# Altium footprint library Connectors Pad Lib.PcbLib: 211 footprints (part 7 of 14)
Each footprint in its own frame and in the unit in brackets; x right, y up, seen from the top. Pads: shape width x height; smd on the part's side, far side on the other; paste and mask are expansions set on the pad; w line width, h text height; cw(c..) or ccw(c..) is an arc to the next point about the centre after c.
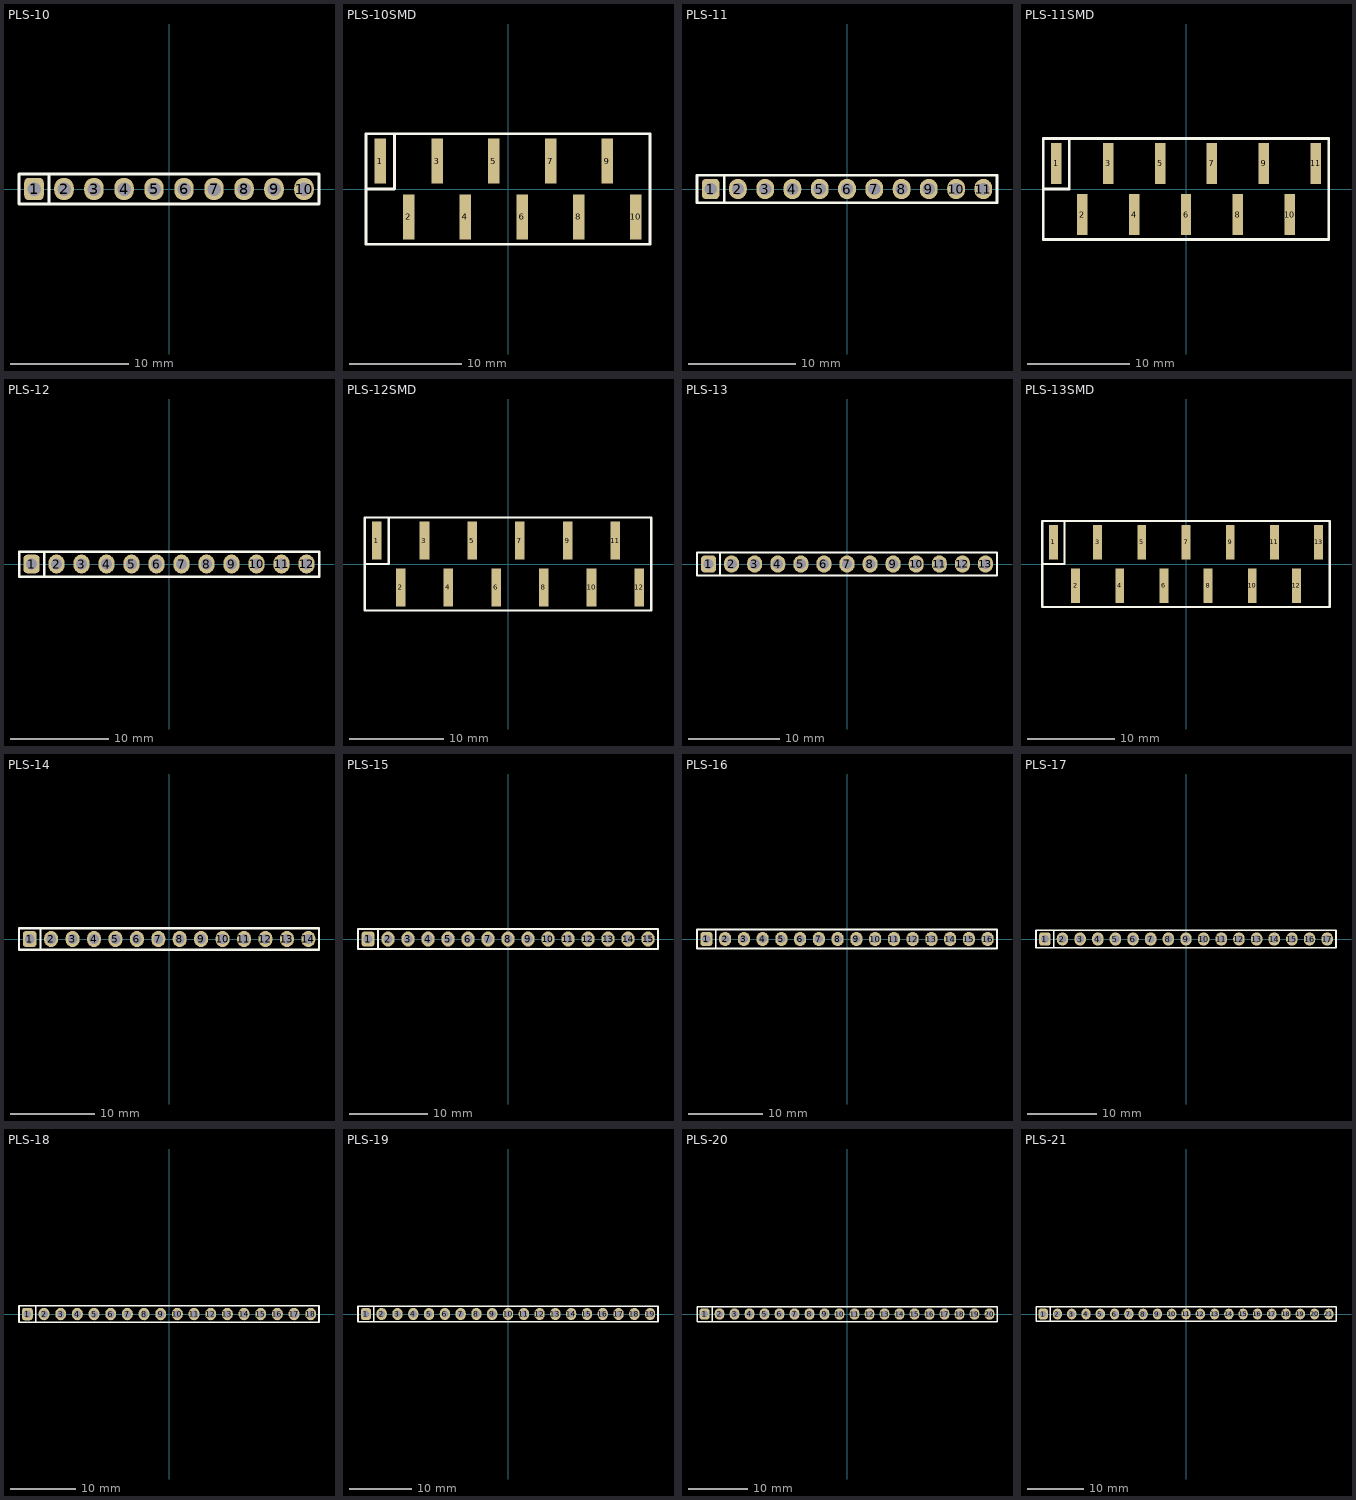
[diagram p6: the footprints below, top view; thin cyan lines are the x and y axes]

## PLS-10 [mil] "PCB Vertical Single Connector 10-Pin"
height 336.22
pads (10):
  rrect50% 65x75 hole 45: 1(-450,0)
  oval 65x75 hole 45: 2(-350,0) 3(-250,0) 4(-150,0) 5(-50,0) 6(50,0) 7(150,0) 8(250,0) 9(350,0) 10(450,0)
Top Overlay:
  lines w10: -400,-50 -400,50 ; -500,-50 -500,50 500,50 500,-50 -500,-50
3D body "PLS-10.STEP": height 337.22, standoff -117.11, extent -500,-50 500,50

## PLS-10SMD [mm] "PCB Vertical Single Connector SMD 10-Pin"
height 10.338
pads (10):
  rect 1.02x4 smd: 1(-11.43,2.5) 2(-8.89,-2.5) 3(-6.35,2.5) 4(-3.81,-2.5) 5(-1.27,2.5) 6(1.27,-2.5) 7(3.81,2.5) 8(6.35,-2.5) 9(8.89,2.5) 10(11.43,-2.5)
Top Overlay:
  lines w0.254: -12.7,0 -10.16,0 -10.16,4.953 -0.127,4.953 ; -12.7,-4.953 12.7,-4.953 12.7,4.953 -12.7,4.953 -12.7,-4.953
3D body "PLS-10SMD.STEP": height 10.34, standoff -0.02, extent -12.7,-4.27 12.7,4.27

## PLS-11 [mil] "PCB Vertical Single Connector 11-Pin"
height 336.22
pads (11):
  rrect50% 65x75 hole 45: 1(-500,0)
  oval 65x75 hole 45: 2(-400,0) 3(-300,0) 4(-200,0) 5(-100,0) 6(0,0) 7(100,0) 8(200,0) 9(300,0) 10(400,0) 11(500,0)
Top Overlay:
  lines w10: -450,-50 -450,50 ; -550,-50 550,-50 550,50 -550,50 -550,-50
3D body "PLS-11.STEP": height 341.16, standoff -117.11, extent -550,-50 550,50

## PLS-11SMD [mm] "PCB Vertical Single Connector SMD 11-Pin"
height 10.338
pads (11):
  rect 1.02x4 smd: 1(-12.7,2.5) 2(-10.16,-2.5) 3(-7.62,2.5) 4(-5.08,-2.5) 5(-2.54,2.5) 6(0,-2.5) 7(2.54,2.5) 8(5.08,-2.5) 9(7.62,2.5) 10(10.16,-2.5) 11(12.7,2.5)
Top Overlay:
  lines w0.254: -13.97,0 -11.43,0 -11.43,4.953 -0.127,4.953 ; -13.97,-4.953 -13.97,4.953 13.97,4.953 13.97,-4.953 -13.97,-4.953
3D body "PLS-11SMD.STEP": height 10.34, standoff -0.02, extent -13.97,-4.27 13.97,4.27

## PLS-12 [mil] "PCB Vertical Single Connector 12-Pin"
height 336.22
pads (12):
  rrect50% 65x75 hole 45: 1(-550,0)
  oval 65x75 hole 45: 2(-450,0) 3(-350,0) 4(-250,0) 5(-150,0) 6(-50,0) 7(50,0) 8(150,0) 9(250,0) 10(350,0) 11(450,0) 12(550,0)
Top Overlay:
  lines w10: -500,-50 -500,50 ; -600,-50 600,-50 600,50 -600,50 -600,-50
3D body "PLS-12.STEP": height 337.22, standoff -117.11, extent -600,-50 600,50

## PLS-12SMD [mm] "PCB Vertical Single Connector SMD 12-Pin"
height 10.338
pads (12):
  rect 1.02x4 smd: 1(-13.97,2.5) 2(-11.43,-2.5) 3(-8.89,2.5) 4(-6.35,-2.5) 5(-3.81,2.5) 6(-1.27,-2.5) 7(1.27,2.5) 8(3.81,-2.5) 9(6.35,2.5) 10(8.89,-2.5) 11(11.43,2.5) 12(13.97,-2.5)
Top Overlay:
  lines w0.254: -15.24,0 -12.7,0 -12.7,4.953 -0.127,4.953 ; -15.24,-4.953 15.24,-4.953 15.24,4.953 -15.24,4.953 -15.24,-4.953
3D body "PLS-12SMD.STEP": height 10.34, standoff -0.02, extent -15.24,-4.27 15.24,4.27

## PLS-13 [mil] "PCB Vertical Single Connector 13-Pin"
height 336.22
pads (13):
  rrect50% 65x75 hole 45: 1(-600,0)
  oval 65x75 hole 45: 2(-500,0) 3(-400,0) 4(-300,0) 5(-200,0) 6(-100,0) 7(0,0) 8(100,0) 9(200,0) 10(300,0) 11(400,0) 12(500,0) 13(600,0)
Top Overlay:
  lines w10: -550,-50 -550,50 ; -650,-50 650,-50 650,50 -650,50 -650,-50
3D body "PLS-13.STEP": height 341.16, standoff -117.11, extent -650,-50 650,50

## PLS-13SMD [mm] "PCB Vertical Single Connector SMD 13-Pin"
height 10.338
pads (13):
  rect 1.02x4 smd: 1(-15.24,2.5) 2(-12.7,-2.5) 3(-10.16,2.5) 4(-7.62,-2.5) 5(-5.08,2.5) 6(-2.54,-2.5) 7(0,2.5) 8(2.54,-2.5) 9(5.08,2.5) 10(7.62,-2.5) 11(10.16,2.5) 12(12.7,-2.5) 13(15.24,2.5)
Top Overlay:
  lines w0.254: -16.51,0 -13.97,0 -13.97,4.953 -0.127,4.953 ; -16.51,-4.953 16.51,-4.953 16.51,4.953 -16.51,4.953 -16.51,-4.953
3D body "PLS-13SMD.STEP": height 10.34, standoff -0.02, extent -16.51,-4.27 16.51,4.27

## PLS-14 [mil] "PCB Vertical Single Connector 14-Pin"
height 336.22
pads (14):
  rrect50% 65x75 hole 45: 1(-650,0)
  oval 65x75 hole 45: 2(-550,0) 3(-450,0) 4(-350,0) 5(-250,0) 6(-150,0) 7(-50,0) 8(50,0) 9(150,0) 10(250,0) 11(350,0) 12(450,0) 13(550,0) 14(650,0)
Top Overlay:
  lines w10: -600,-50 -600,50 ; -700,-50 700,-50 700,50 -700,50 -700,-50
3D body "PLS-14.STEP": height 337.22, standoff -117.11, extent -700,-50 700,50

## PLS-15 [mil] "PCB Vertical Single Connector 15-Pin"
height 336.22
pads (15):
  rrect50% 65x75 hole 45: 1(-700,0)
  oval 65x75 hole 45: 2(-600,0) 3(-500,0) 4(-400,0) 5(-300,0) 6(-200,0) 7(-100,0) 8(0,0) 9(100,0) 10(200,0) 11(300,0) 12(400,0) 13(500,0) 14(600,0) 15(700,0)
Top Overlay:
  lines w10: -650,-50 -650,50 ; -750,-50 750,-50 750,50 -750,50 -750,-50
3D body "PLS-15.STEP": height 341.16, standoff -117.11, extent -750,-50 750,50

## PLS-16 [mil] "PCB Vertical Single Connector 16-Pin"
height 336.22
pads (16):
  rrect50% 65x75 hole 45: 1(-750,0)
  oval 65x75 hole 45: 2(-650,0) 3(-550,0) 4(-450,0) 5(-350,0) 6(-250,0) 7(-150,0) 8(-50,0) 9(50,0) 10(150,0) 11(250,0) 12(350,0) 13(450,0) 14(550,0) 15(650,0) 16(750,0)
Top Overlay:
  lines w10: -700,-50 -700,50 ; -800,-50 800,-50 800,50 -800,50 -800,-50
3D body "PLS-16.STEP": height 337.22, standoff -117.11, extent -800,-50 800,50

## PLS-17 [mil] "PCB Vertical Single Connector 17-Pin"
height 336.22
pads (17):
  rrect50% 65x75 hole 45: 1(-800,0)
  oval 65x75 hole 45: 2(-700,0) 3(-600,0) 4(-500,0) 5(-400,0) 6(-300,0) 7(-200,0) 8(-100,0) 9(0,0) 10(100,0) 11(200,0) 12(300,0) 13(400,0) 14(500,0) 15(600,0) 16(700,0) 17(800,0)
Top Overlay:
  lines w10: -750,-50 -750,50 ; -850,-50 850,-50 850,50 -850,50 -850,-50
3D body "PLS-17.STEP": height 341.16, standoff -117.11, extent -850,-50 850,50

## PLS-18 [mil] "PCB Vertical Single Connector 18-Pin"
height 336.22
pads (18):
  rrect50% 65x75 hole 45: 1(-850,0)
  oval 65x75 hole 45: 2(-750,0) 3(-650,0) 4(-550,0) 5(-450,0) 6(-350,0) 7(-250,0) 8(-150,0) 9(-50,0) 10(50,0) 11(150,0) 12(250,0) 13(350,0) 14(450,0) 15(550,0) 16(650,0) 17(750,0) 18(850,0)
Top Overlay:
  lines w10: -800,-50 -800,50 ; -900,-50 900,-50 900,50 -900,50 -900,-50
3D body "PLS-18.STEP": height 337.22, standoff -117.11, extent -900,-50 900,50

## PLS-19 [mil] "PCB Vertical Single Connector 19-Pin"
height 336.22
pads (19):
  rrect50% 65x75 hole 45: 1(-900,0)
  oval 65x75 hole 45: 2(-800,0) 3(-700,0) 4(-600,0) 5(-500,0) 6(-400,0) 7(-300,0) 8(-200,0) 9(-100,0) 10(0,0) 11(100,0) 12(200,0) 13(300,0) 14(400,0) 15(500,0) 16(600,0) 17(700,0) 18(800,0) 19(900,0)
Top Overlay:
  lines w10: -850,-50 -850,50 ; -950,-50 -950,50 950,50 950,-50 -950,-50
3D body "PLS-19.STEP": height 341.16, standoff -117.11, extent -950,-50 950,50

## PLS-20 [mil] "PCB Vertical Single Connector 20-Pin"
height 336.22
pads (20):
  rrect50% 65x75 hole 45: 1(-950,0)
  oval 65x75 hole 45: 2(-850,0) 3(-750,0) 4(-650,0) 5(-550,0) 6(-450,0) 7(-350,0) 8(-250,0) 9(-150,0) 10(-50,0) 11(50,0) 12(150,0) 13(250,0) 14(350,0) 15(450,0) 16(550,0) 17(650,0) 18(750,0) 19(850,0) 20(950,0)
Top Overlay:
  lines w10: -900,-50 -900,50 ; -1000,-50 -1000,50 1000,50 1000,-50 -1000,-50
3D body "PLS-20.STEP": height 337.22, standoff -117.11, extent -1000,-50 1000,50

## PLS-21 [mil] "PCB Vertical Single Connector 21-Pin"
height 336.22
pads (21):
  rrect50% 65x75 hole 45: 1(-1000,0)
  oval 65x75 hole 45: 2(-900,0) 3(-800,0) 4(-700,0) 5(-600,0) 6(-500,0) 7(-400,0) 8(-300,0) 9(-200,0) 10(-100,0) 11(0,0) 12(100,0) 13(200,0) 14(300,0) 15(400,0) 16(500,0) 17(600,0) 18(700,0) 19(800,0) 20(900,0) 21(1000,0)
Top Overlay:
  lines w10: -950,-50 -950,50 ; -1050,-50 -1050,50 1050,50 1050,-50 -1050,-50
3D body "PLS-21.STEP": height 341.16, standoff -117.11, extent -1050,-50 1050,50